# Altium integrated library Weidmueller_OMNIMATE_Signal.IntLib: 2550 symbols (part 30 of 45)
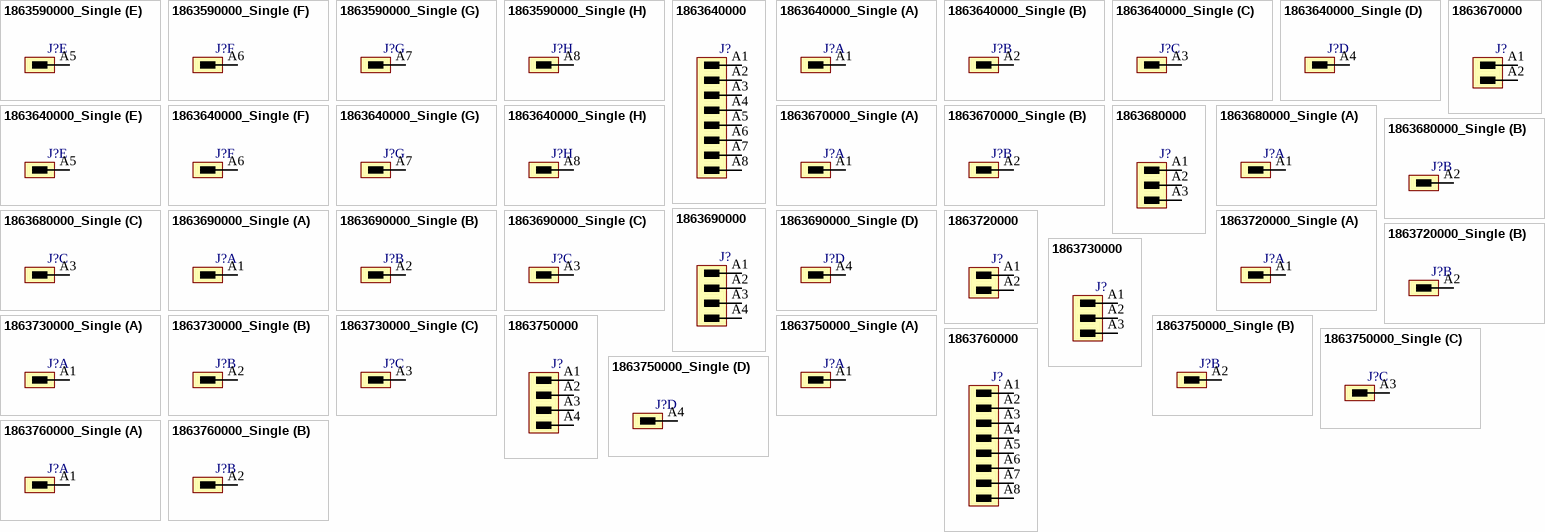
[diagram p240: symbols 1863590000_Single to 1863760000_Single]

## 1863720000
designator J?
OMNIMATE Signal - series BC/SC 3.81; PartNumber: 1863720000; Manufacturer: Weidmueller; Short_text_for_material: SC-SMT 3.81/02/180G 1.5SN BK BX; Side_termination_characteristic: closed side; Mounting_onto_the_PCB: Reflow solder connection; Pitch_mm: 3.81 mm; Pitch_inch: 0.15 inch; No_of_poles: 2; Outgoing_elbow: 180°; Solder_pin_length_mm: 1.5 mm; Contact_surface: tinned; Insulating_material: LCP GF; UL_94_flammability_rating: V-0; Rated_voltage_for_surge_voltage_class_pollution_degree_II_2: 320 V; Rated_current_min_no_of_poles_TU_20_deg_C: 17.5 A; Rated_voltage_use_group_B_UL_1059: 300 V; Rated_current_use_group_B_UL_1059: 10 A; PackageReference: SC_SMT_3_81_180G_02; Colour: Black; Packaging: Box; Qty: 50 PCS; Revision: V1; ComponentLink1Description: Manufacturer URL; ComponentLink1URL: http://www.weidmueller.com/; ComponentLink2Description: URL Link1; ComponentLink2URL: http://catalog.weidmueller.com/catalog/Start.do?localeId=en&ObjectID=1863720000
footprint SC_SMT_3_81_180G_02 (OMNIMATE Signal - Serie BC/SC 3.81  SC-SMT 3.81/02/180G 3.2)
pins: A1, A2

## 1863720000_Single
designator J?
OMNIMATE Signal - series BC/SC 3.81; PartNumber: 1863720000; Manufacturer: Weidmueller; Short_text_for_material: SC-SMT 3.81/02/180G 1.5SN BK BX; Side_termination_characteristic: closed side; Mounting_onto_the_PCB: Reflow solder connection; Pitch_mm: 3.81 mm; Pitch_inch: 0.15 inch; No_of_poles: 2; Outgoing_elbow: 180°; Solder_pin_length_mm: 1.5 mm; Contact_surface: tinned; Insulating_material: LCP GF; UL_94_flammability_rating: V-0; Rated_voltage_for_surge_voltage_class_pollution_degree_II_2: 320 V; Rated_current_min_no_of_poles_TU_20_deg_C: 17.5 A; Rated_voltage_use_group_B_UL_1059: 300 V; Rated_current_use_group_B_UL_1059: 10 A; PackageReference: SC_SMT_3_81_180G_02; Colour: Black; Packaging: Box; Qty: 50 PCS; Revision: V1; ComponentLink1Description: Manufacturer URL; ComponentLink1URL: http://www.weidmueller.com/; ComponentLink2Description: URL Link1; ComponentLink2URL: http://catalog.weidmueller.com/catalog/Start.do?localeId=en&ObjectID=1863720000
footprint SC_SMT_3_81_180G_02 (OMNIMATE Signal - Serie BC/SC 3.81  SC-SMT 3.81/02/180G 3.2)
part A pins: A1
part B pins: A2

## 1863730000
designator J?
OMNIMATE Signal - series BC/SC 3.81; PartNumber: 1863730000; Manufacturer: Weidmueller; Short_text_for_material: SC-SMT 3.81/03/180G 1.5SN BK BX; Side_termination_characteristic: closed side; Mounting_onto_the_PCB: Reflow solder connection; Pitch_mm: 3.81 mm; Pitch_inch: 0.15 inch; No_of_poles: 3; Outgoing_elbow: 180°; Solder_pin_length_mm: 1.5 mm; Contact_surface: tinned; Insulating_material: LCP GF; UL_94_flammability_rating: V-0; Rated_voltage_for_surge_voltage_class_pollution_degree_II_2: 320 V; Rated_current_min_no_of_poles_TU_20_deg_C: 17.5 A; Rated_voltage_use_group_B_UL_1059: 300 V; Rated_current_use_group_B_UL_1059: 10 A; PackageReference: SC_SMT_3_81_180G_03; Colour: Black; Packaging: Box; Qty: 50 PCS; Revision: V1; ComponentLink1Description: Manufacturer URL; ComponentLink1URL: http://www.weidmueller.com/; ComponentLink2Description: URL Link1; ComponentLink2URL: http://catalog.weidmueller.com/catalog/Start.do?localeId=en&ObjectID=1863730000
footprint SC_SMT_3_81_180G_03 (OMNIMATE Signal - Serie BC/SC 3.81  SC-SMT 3.81/03/180G 3.2)
pins: A1, A2, A3

## 1863730000_Single
designator J?
OMNIMATE Signal - series BC/SC 3.81; PartNumber: 1863730000; Manufacturer: Weidmueller; Short_text_for_material: SC-SMT 3.81/03/180G 1.5SN BK BX; Side_termination_characteristic: closed side; Mounting_onto_the_PCB: Reflow solder connection; Pitch_mm: 3.81 mm; Pitch_inch: 0.15 inch; No_of_poles: 3; Outgoing_elbow: 180°; Solder_pin_length_mm: 1.5 mm; Contact_surface: tinned; Insulating_material: LCP GF; UL_94_flammability_rating: V-0; Rated_voltage_for_surge_voltage_class_pollution_degree_II_2: 320 V; Rated_current_min_no_of_poles_TU_20_deg_C: 17.5 A; Rated_voltage_use_group_B_UL_1059: 300 V; Rated_current_use_group_B_UL_1059: 10 A; PackageReference: SC_SMT_3_81_180G_03; Colour: Black; Packaging: Box; Qty: 50 PCS; Revision: V1; ComponentLink1Description: Manufacturer URL; ComponentLink1URL: http://www.weidmueller.com/; ComponentLink2Description: URL Link1; ComponentLink2URL: http://catalog.weidmueller.com/catalog/Start.do?localeId=en&ObjectID=1863730000
footprint SC_SMT_3_81_180G_03 (OMNIMATE Signal - Serie BC/SC 3.81  SC-SMT 3.81/03/180G 3.2)
part A pins: A1
part B pins: A2
part C pins: A3

## 1863750000
designator J?
OMNIMATE Signal - series BC/SC 3.81; PartNumber: 1863750000; Manufacturer: Weidmueller; Short_text_for_material: SC-SMT 3.81/04/180G 1.5SN BK BX; Side_termination_characteristic: closed side; Mounting_onto_the_PCB: Reflow solder connection; Pitch_mm: 3.81 mm; Pitch_inch: 0.15 inch; No_of_poles: 4; Outgoing_elbow: 180°; Solder_pin_length_mm: 1.5 mm; Contact_surface: tinned; Insulating_material: LCP GF; UL_94_flammability_rating: V-0; Rated_voltage_for_surge_voltage_class_pollution_degree_II_2: 320 V; Rated_current_min_no_of_poles_TU_20_deg_C: 17.5 A; Rated_voltage_use_group_B_UL_1059: 300 V; Rated_current_use_group_B_UL_1059: 10 A; PackageReference: SC_SMT_3_81_180G_04; Colour: Black; Packaging: Box; Qty: 50 PCS; Revision: V1; ComponentLink1Description: Manufacturer URL; ComponentLink1URL: http://www.weidmueller.com/; ComponentLink2Description: URL Link1; ComponentLink2URL: http://catalog.weidmueller.com/catalog/Start.do?localeId=en&ObjectID=1863750000
footprint SC_SMT_3_81_180G_04 (OMNIMATE Signal - Serie BC/SC 3.81  SC-SMT 3.81/04/180G 3.2)
pins: A1, A2, A3, A4

## 1863750000_Single
designator J?
OMNIMATE Signal - series BC/SC 3.81; PartNumber: 1863750000; Manufacturer: Weidmueller; Short_text_for_material: SC-SMT 3.81/04/180G 1.5SN BK BX; Side_termination_characteristic: closed side; Mounting_onto_the_PCB: Reflow solder connection; Pitch_mm: 3.81 mm; Pitch_inch: 0.15 inch; No_of_poles: 4; Outgoing_elbow: 180°; Solder_pin_length_mm: 1.5 mm; Contact_surface: tinned; Insulating_material: LCP GF; UL_94_flammability_rating: V-0; Rated_voltage_for_surge_voltage_class_pollution_degree_II_2: 320 V; Rated_current_min_no_of_poles_TU_20_deg_C: 17.5 A; Rated_voltage_use_group_B_UL_1059: 300 V; Rated_current_use_group_B_UL_1059: 10 A; PackageReference: SC_SMT_3_81_180G_04; Colour: Black; Packaging: Box; Qty: 50 PCS; Revision: V1; ComponentLink1Description: Manufacturer URL; ComponentLink1URL: http://www.weidmueller.com/; ComponentLink2Description: URL Link1; ComponentLink2URL: http://catalog.weidmueller.com/catalog/Start.do?localeId=en&ObjectID=1863750000
footprint SC_SMT_3_81_180G_04 (OMNIMATE Signal - Serie BC/SC 3.81  SC-SMT 3.81/04/180G 3.2)
part A pins: A1
part B pins: A2
part C pins: A3
part D pins: A4

## 1863760000
designator J?
OMNIMATE Signal - series BC/SC 3.81; PartNumber: 1863760000; Manufacturer: Weidmueller; Short_text_for_material: SC-SMT 3.81/08/90LF 3.2SN BK BX; Side_termination_characteristic: Solder flange; Mounting_onto_the_PCB: Reflow solder connection; Pitch_mm: 3.81 mm; Pitch_inch: 0.15 inch; No_of_poles: 8; Outgoing_elbow: 90°; Solder_pin_length_mm: 3.2 mm; Contact_material: Cu-Leg; Contact_surface: tinned; Insulating_material: LCP GF; UL_94_flammability_rating: V-0; Rated_voltage_for_surge_voltage_class_pollution_degree_II_2: 320 V; Rated_current_min_no_of_poles_TU_20_deg_C: 19 A; Rated_voltage_use_group_B_UL_1059: 300 V; Rated_current_use_group_B_UL_1059: 10 A; PackageReference: SC_SMT_3_81_90LF_08; Colour: Black; Packaging: Box; Qty: 50 PCS; Revision: V1; ComponentLink1Description: Manufacturer URL; ComponentLink1URL: http://www.weidmueller.com/; ComponentLink2Description: URL Link1; ComponentLink2URL: http://catalog.weidmueller.com/catalog/Start.do?localeId=en&ObjectID=1863760000
footprint SC_SMT_3_81_90LF_08 (OMNIMATE Signal - Serie BC/SC 3.81  SC-SMT 3.81/08/90LF 3.2)
pins: A1, A2, A3, A4, A5, A6, A7, A8

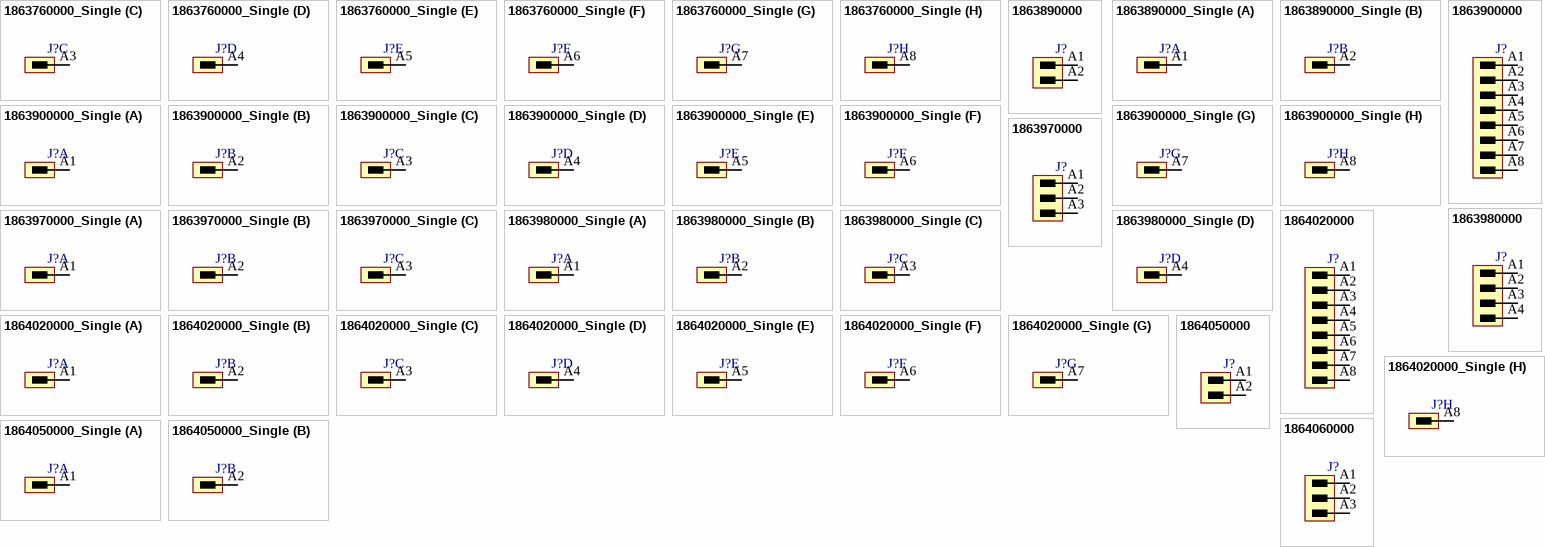
[diagram p149: symbols 1863760000_Single to 1864060000]

## 1863760000_Single
designator J?
OMNIMATE Signal - series BC/SC 3.81; PartNumber: 1863760000; Manufacturer: Weidmueller; Short_text_for_material: SC-SMT 3.81/08/90LF 3.2SN BK BX; Side_termination_characteristic: Solder flange; Mounting_onto_the_PCB: Reflow solder connection; Pitch_mm: 3.81 mm; Pitch_inch: 0.15 inch; No_of_poles: 8; Outgoing_elbow: 90°; Solder_pin_length_mm: 3.2 mm; Contact_material: Cu-Leg; Contact_surface: tinned; Insulating_material: LCP GF; UL_94_flammability_rating: V-0; Rated_voltage_for_surge_voltage_class_pollution_degree_II_2: 320 V; Rated_current_min_no_of_poles_TU_20_deg_C: 19 A; Rated_voltage_use_group_B_UL_1059: 300 V; Rated_current_use_group_B_UL_1059: 10 A; PackageReference: SC_SMT_3_81_90LF_08; Colour: Black; Packaging: Box; Qty: 50 PCS; Revision: V1; ComponentLink1Description: Manufacturer URL; ComponentLink1URL: http://www.weidmueller.com/; ComponentLink2Description: URL Link1; ComponentLink2URL: http://catalog.weidmueller.com/catalog/Start.do?localeId=en&ObjectID=1863760000
footprint SC_SMT_3_81_90LF_08 (OMNIMATE Signal - Serie BC/SC 3.81  SC-SMT 3.81/08/90LF 3.2)
part A pins: A1
part B pins: A2
part C pins: A3
part D pins: A4
part E pins: A5
part F pins: A6
part G pins: A7
part H pins: A8

## 1863890000
designator J?
OMNIMATE Signal - series BC/SC 3.81; PartNumber: 1863890000; Manufacturer: Weidmueller; Short_text_for_material: SC-SMT 3.81/02/90LF 3.2SN BK RL; Side_termination_characteristic: Solder flange; Mounting_onto_the_PCB: Reflow solder connection; Pitch_mm: 3.81 mm; Pitch_inch: 0.15 inch; No_of_poles: 2; Outgoing_elbow: 90°; Solder_pin_length_mm: 3.2 mm; Contact_surface: tinned; Insulating_material: LCP GF; UL_94_flammability_rating: V-0; Rated_voltage_for_surge_voltage_class_pollution_degree_II_2: 320 V; Rated_current_min_no_of_poles_TU_20_deg_C: 17.5 A; Rated_voltage_use_group_B_UL_1059: 300 V; Rated_current_use_group_B_UL_1059: 10 A; PackageReference: SC_SMT_3_81_90LF_02; Colour: Black; Packaging: Tape; Qty: 400 PCS; Revision: V1; ComponentLink1Description: Manufacturer URL; ComponentLink1URL: http://www.weidmueller.com/; ComponentLink2Description: URL Link1; ComponentLink2URL: http://catalog.weidmueller.com/catalog/Start.do?localeId=en&ObjectID=1863890000
footprint SC_SMT_3_81_90LF_02 (OMNIMATE Signal - Serie BC/SC 3.81  SC-SMT 3.81/02/90LF 3.2)
pins: A1, A2

## 1863890000_Single
designator J?
OMNIMATE Signal - series BC/SC 3.81; PartNumber: 1863890000; Manufacturer: Weidmueller; Short_text_for_material: SC-SMT 3.81/02/90LF 3.2SN BK RL; Side_termination_characteristic: Solder flange; Mounting_onto_the_PCB: Reflow solder connection; Pitch_mm: 3.81 mm; Pitch_inch: 0.15 inch; No_of_poles: 2; Outgoing_elbow: 90°; Solder_pin_length_mm: 3.2 mm; Contact_surface: tinned; Insulating_material: LCP GF; UL_94_flammability_rating: V-0; Rated_voltage_for_surge_voltage_class_pollution_degree_II_2: 320 V; Rated_current_min_no_of_poles_TU_20_deg_C: 17.5 A; Rated_voltage_use_group_B_UL_1059: 300 V; Rated_current_use_group_B_UL_1059: 10 A; PackageReference: SC_SMT_3_81_90LF_02; Colour: Black; Packaging: Tape; Qty: 400 PCS; Revision: V1; ComponentLink1Description: Manufacturer URL; ComponentLink1URL: http://www.weidmueller.com/; ComponentLink2Description: URL Link1; ComponentLink2URL: http://catalog.weidmueller.com/catalog/Start.do?localeId=en&ObjectID=1863890000
footprint SC_SMT_3_81_90LF_02 (OMNIMATE Signal - Serie BC/SC 3.81  SC-SMT 3.81/02/90LF 3.2)
part A pins: A1
part B pins: A2

## 1863900000
designator J?
OMNIMATE Signal - series BC/SC 3.81; PartNumber: 1863900000; Manufacturer: Weidmueller; Short_text_for_material: SC-SMT 3.81/08/180G 1.5SN BK BX; Side_termination_characteristic: closed side; Mounting_onto_the_PCB: Reflow solder connection; Pitch_mm: 3.81 mm; Pitch_inch: 0.15 inch; No_of_poles: 8; Outgoing_elbow: 180°; Solder_pin_length_mm: 1.5 mm; Contact_surface: tinned; Insulating_material: LCP GF; UL_94_flammability_rating: V-0; Rated_voltage_for_surge_voltage_class_pollution_degree_II_2: 320 V; Rated_current_min_no_of_poles_TU_20_deg_C: 17.5 A; Rated_voltage_use_group_B_UL_1059: 300 V; Rated_current_use_group_B_UL_1059: 10 A; PackageReference: SC_SMT_3_81_180G_08; Colour: Black; Packaging: Box; Qty: 50 PCS; Revision: V1; ComponentLink1Description: Manufacturer URL; ComponentLink1URL: http://www.weidmueller.com/; ComponentLink2Description: URL Link1; ComponentLink2URL: http://catalog.weidmueller.com/catalog/Start.do?localeId=en&ObjectID=1863900000
footprint SC_SMT_3_81_180G_08 (OMNIMATE Signal - Serie BC/SC 3.81  SC-SMT 3.81/08/180G 3.2)
pins: A1, A2, A3, A4, A5, A6, A7, A8

## 1863900000_Single
designator J?
OMNIMATE Signal - series BC/SC 3.81; PartNumber: 1863900000; Manufacturer: Weidmueller; Short_text_for_material: SC-SMT 3.81/08/180G 1.5SN BK BX; Side_termination_characteristic: closed side; Mounting_onto_the_PCB: Reflow solder connection; Pitch_mm: 3.81 mm; Pitch_inch: 0.15 inch; No_of_poles: 8; Outgoing_elbow: 180°; Solder_pin_length_mm: 1.5 mm; Contact_surface: tinned; Insulating_material: LCP GF; UL_94_flammability_rating: V-0; Rated_voltage_for_surge_voltage_class_pollution_degree_II_2: 320 V; Rated_current_min_no_of_poles_TU_20_deg_C: 17.5 A; Rated_voltage_use_group_B_UL_1059: 300 V; Rated_current_use_group_B_UL_1059: 10 A; PackageReference: SC_SMT_3_81_180G_08; Colour: Black; Packaging: Box; Qty: 50 PCS; Revision: V1; ComponentLink1Description: Manufacturer URL; ComponentLink1URL: http://www.weidmueller.com/; ComponentLink2Description: URL Link1; ComponentLink2URL: http://catalog.weidmueller.com/catalog/Start.do?localeId=en&ObjectID=1863900000
footprint SC_SMT_3_81_180G_08 (OMNIMATE Signal - Serie BC/SC 3.81  SC-SMT 3.81/08/180G 3.2)
part A pins: A1
part B pins: A2
part C pins: A3
part D pins: A4
part E pins: A5
part F pins: A6
part G pins: A7
part H pins: A8

## 1863970000
designator J?
OMNIMATE Signal - series BC/SC 3.81; PartNumber: 1863970000; Manufacturer: Weidmueller; Short_text_for_material: SC-SMT 3.81/03/90LF 3.2SN BK RL; Side_termination_characteristic: Solder flange; Mounting_onto_the_PCB: Reflow solder connection; Pitch_mm: 3.81 mm; Pitch_inch: 0.15 inch; No_of_poles: 3; Outgoing_elbow: 90°; Solder_pin_length_mm: 3.2 mm; Contact_surface: tinned; Insulating_material: LCP GF; UL_94_flammability_rating: V-0; Rated_voltage_for_surge_voltage_class_pollution_degree_II_2: 320 V; Rated_current_min_no_of_poles_TU_20_deg_C: 17.5 A; Rated_voltage_use_group_B_UL_1059: 300 V; Rated_current_use_group_B_UL_1059: 10 A; PackageReference: SC_SMT_3_81_90LF_03; Colour: Black; Packaging: Tape; Qty: 400 PCS; Revision: V1; ComponentLink1Description: Manufacturer URL; ComponentLink1URL: http://www.weidmueller.com/; ComponentLink2Description: URL Link1; ComponentLink2URL: http://catalog.weidmueller.com/catalog/Start.do?localeId=en&ObjectID=1863970000
footprint SC_SMT_3_81_90LF_03 (OMNIMATE Signal - Serie BC/SC 3.81  SC-SMT 3.81/03/90LF 3.2)
pins: A1, A2, A3

## 1863970000_Single
designator J?
OMNIMATE Signal - series BC/SC 3.81; PartNumber: 1863970000; Manufacturer: Weidmueller; Short_text_for_material: SC-SMT 3.81/03/90LF 3.2SN BK RL; Side_termination_characteristic: Solder flange; Mounting_onto_the_PCB: Reflow solder connection; Pitch_mm: 3.81 mm; Pitch_inch: 0.15 inch; No_of_poles: 3; Outgoing_elbow: 90°; Solder_pin_length_mm: 3.2 mm; Contact_surface: tinned; Insulating_material: LCP GF; UL_94_flammability_rating: V-0; Rated_voltage_for_surge_voltage_class_pollution_degree_II_2: 320 V; Rated_current_min_no_of_poles_TU_20_deg_C: 17.5 A; Rated_voltage_use_group_B_UL_1059: 300 V; Rated_current_use_group_B_UL_1059: 10 A; PackageReference: SC_SMT_3_81_90LF_03; Colour: Black; Packaging: Tape; Qty: 400 PCS; Revision: V1; ComponentLink1Description: Manufacturer URL; ComponentLink1URL: http://www.weidmueller.com/; ComponentLink2Description: URL Link1; ComponentLink2URL: http://catalog.weidmueller.com/catalog/Start.do?localeId=en&ObjectID=1863970000
footprint SC_SMT_3_81_90LF_03 (OMNIMATE Signal - Serie BC/SC 3.81  SC-SMT 3.81/03/90LF 3.2)
part A pins: A1
part B pins: A2
part C pins: A3

## 1863980000
designator J?
OMNIMATE Signal - series BC/SC 3.81; PartNumber: 1863980000; Manufacturer: Weidmueller; Short_text_for_material: SC-SMT 3.81/04/90LF 3.2SN BK RL; Side_termination_characteristic: Solder flange; Mounting_onto_the_PCB: Reflow solder connection; Pitch_mm: 3.81 mm; Pitch_inch: 0.15 inch; No_of_poles: 4; Outgoing_elbow: 90°; Solder_pin_length_mm: 3.2 mm; Contact_surface: tinned; Insulating_material: LCP GF; UL_94_flammability_rating: V-0; Rated_voltage_for_surge_voltage_class_pollution_degree_II_2: 320 V; Rated_current_min_no_of_poles_TU_20_deg_C: 17.5 A; Rated_voltage_use_group_B_UL_1059: 300 V; Rated_current_use_group_B_UL_1059: 10 A; PackageReference: SC_SMT_3_81_90LF_04; Colour: Black; Packaging: Tape; Qty: 400 PCS; Revision: V1; ComponentLink1Description: Manufacturer URL; ComponentLink1URL: http://www.weidmueller.com/; ComponentLink2Description: URL Link1; ComponentLink2URL: http://catalog.weidmueller.com/catalog/Start.do?localeId=en&ObjectID=1863980000
footprint SC_SMT_3_81_90LF_04 (OMNIMATE Signal - Serie BC/SC 3.81  SC-SMT 3.81/04/90LF 3.2)
pins: A1, A2, A3, A4

## 1863980000_Single
designator J?
OMNIMATE Signal - series BC/SC 3.81; PartNumber: 1863980000; Manufacturer: Weidmueller; Short_text_for_material: SC-SMT 3.81/04/90LF 3.2SN BK RL; Side_termination_characteristic: Solder flange; Mounting_onto_the_PCB: Reflow solder connection; Pitch_mm: 3.81 mm; Pitch_inch: 0.15 inch; No_of_poles: 4; Outgoing_elbow: 90°; Solder_pin_length_mm: 3.2 mm; Contact_surface: tinned; Insulating_material: LCP GF; UL_94_flammability_rating: V-0; Rated_voltage_for_surge_voltage_class_pollution_degree_II_2: 320 V; Rated_current_min_no_of_poles_TU_20_deg_C: 17.5 A; Rated_voltage_use_group_B_UL_1059: 300 V; Rated_current_use_group_B_UL_1059: 10 A; PackageReference: SC_SMT_3_81_90LF_04; Colour: Black; Packaging: Tape; Qty: 400 PCS; Revision: V1; ComponentLink1Description: Manufacturer URL; ComponentLink1URL: http://www.weidmueller.com/; ComponentLink2Description: URL Link1; ComponentLink2URL: http://catalog.weidmueller.com/catalog/Start.do?localeId=en&ObjectID=1863980000
footprint SC_SMT_3_81_90LF_04 (OMNIMATE Signal - Serie BC/SC 3.81  SC-SMT 3.81/04/90LF 3.2)
part A pins: A1
part B pins: A2
part C pins: A3
part D pins: A4

## 1864020000
designator J?
OMNIMATE Signal - series BC/SC 3.81; PartNumber: 1864020000; Manufacturer: Weidmueller; Short_text_for_material: SC-SMT 3.81/08/90LF 3.2SN BK RL; Side_termination_characteristic: Solder flange; Mounting_onto_the_PCB: Reflow solder connection; Pitch_mm: 3.81 mm; Pitch_inch: 0.15 inch; No_of_poles: 8; Outgoing_elbow: 90°; Solder_pin_length_mm: 3.2 mm; Contact_surface: tinned; Insulating_material: LCP GF; UL_94_flammability_rating: V-0; Rated_voltage_for_surge_voltage_class_pollution_degree_II_2: 320 V; Rated_current_min_no_of_poles_TU_20_deg_C: 17.5 A; Rated_voltage_use_group_B_UL_1059: 300 V; Rated_current_use_group_B_UL_1059: 10 A; PackageReference: SC_SMT_3_81_90LF_08; Colour: Black; Packaging: Tape; Qty: 400 PCS; Revision: V1; ComponentLink1Description: Manufacturer URL; ComponentLink1URL: http://www.weidmueller.com/; ComponentLink2Description: URL Link1; ComponentLink2URL: http://catalog.weidmueller.com/catalog/Start.do?localeId=en&ObjectID=1864020000
footprint SC_SMT_3_81_90LF_08 (OMNIMATE Signal - Serie BC/SC 3.81  SC-SMT 3.81/08/90LF 3.2)
pins: A1, A2, A3, A4, A5, A6, A7, A8

## 1864020000_Single
designator J?
OMNIMATE Signal - series BC/SC 3.81; PartNumber: 1864020000; Manufacturer: Weidmueller; Short_text_for_material: SC-SMT 3.81/08/90LF 3.2SN BK RL; Side_termination_characteristic: Solder flange; Mounting_onto_the_PCB: Reflow solder connection; Pitch_mm: 3.81 mm; Pitch_inch: 0.15 inch; No_of_poles: 8; Outgoing_elbow: 90°; Solder_pin_length_mm: 3.2 mm; Contact_surface: tinned; Insulating_material: LCP GF; UL_94_flammability_rating: V-0; Rated_voltage_for_surge_voltage_class_pollution_degree_II_2: 320 V; Rated_current_min_no_of_poles_TU_20_deg_C: 17.5 A; Rated_voltage_use_group_B_UL_1059: 300 V; Rated_current_use_group_B_UL_1059: 10 A; PackageReference: SC_SMT_3_81_90LF_08; Colour: Black; Packaging: Tape; Qty: 400 PCS; Revision: V1; ComponentLink1Description: Manufacturer URL; ComponentLink1URL: http://www.weidmueller.com/; ComponentLink2Description: URL Link1; ComponentLink2URL: http://catalog.weidmueller.com/catalog/Start.do?localeId=en&ObjectID=1864020000
footprint SC_SMT_3_81_90LF_08 (OMNIMATE Signal - Serie BC/SC 3.81  SC-SMT 3.81/08/90LF 3.2)
part A pins: A1
part B pins: A2
part C pins: A3
part D pins: A4
part E pins: A5
part F pins: A6
part G pins: A7
part H pins: A8

## 1864050000
designator J?
OMNIMATE Signal - series BC/SC 3.81; PartNumber: 1864050000; Manufacturer: Weidmueller; Short_text_for_material: SC-SMT 3.81/02/180G 1.5SN BK RL; Side_termination_characteristic: closed side; Mounting_onto_the_PCB: Reflow solder connection; Pitch_mm: 3.81 mm; Pitch_inch: 0.15 inch; No_of_poles: 2; Outgoing_elbow: 180°; Solder_pin_length_mm: 1.5 mm; Contact_surface: tinned; Insulating_material: LCP GF; UL_94_flammability_rating: V-0; Rated_voltage_for_surge_voltage_class_pollution_degree_II_2: 320 V; Rated_current_min_no_of_poles_TU_20_deg_C: 17.5 A; Rated_voltage_use_group_B_UL_1059: 300 V; Rated_current_use_group_B_UL_1059: 10 A; PackageReference: SC_SMT_3_81_180G_02; Colour: Black; Packaging: Tape; Qty: 300 PCS; Revision: V1; ComponentLink1Description: Manufacturer URL; ComponentLink1URL: http://www.weidmueller.com/; ComponentLink2Description: URL Link1; ComponentLink2URL: http://catalog.weidmueller.com/catalog/Start.do?localeId=en&ObjectID=1864050000
footprint SC_SMT_3_81_180G_02 (OMNIMATE Signal - Serie BC/SC 3.81  SC-SMT 3.81/02/180G 3.2)
pins: A1, A2

## 1864050000_Single
designator J?
OMNIMATE Signal - series BC/SC 3.81; PartNumber: 1864050000; Manufacturer: Weidmueller; Short_text_for_material: SC-SMT 3.81/02/180G 1.5SN BK RL; Side_termination_characteristic: closed side; Mounting_onto_the_PCB: Reflow solder connection; Pitch_mm: 3.81 mm; Pitch_inch: 0.15 inch; No_of_poles: 2; Outgoing_elbow: 180°; Solder_pin_length_mm: 1.5 mm; Contact_surface: tinned; Insulating_material: LCP GF; UL_94_flammability_rating: V-0; Rated_voltage_for_surge_voltage_class_pollution_degree_II_2: 320 V; Rated_current_min_no_of_poles_TU_20_deg_C: 17.5 A; Rated_voltage_use_group_B_UL_1059: 300 V; Rated_current_use_group_B_UL_1059: 10 A; PackageReference: SC_SMT_3_81_180G_02; Colour: Black; Packaging: Tape; Qty: 300 PCS; Revision: V1; ComponentLink1Description: Manufacturer URL; ComponentLink1URL: http://www.weidmueller.com/; ComponentLink2Description: URL Link1; ComponentLink2URL: http://catalog.weidmueller.com/catalog/Start.do?localeId=en&ObjectID=1864050000
footprint SC_SMT_3_81_180G_02 (OMNIMATE Signal - Serie BC/SC 3.81  SC-SMT 3.81/02/180G 3.2)
part A pins: A1
part B pins: A2

## 1864060000
designator J?
OMNIMATE Signal - series BC/SC 3.81; PartNumber: 1864060000; Manufacturer: Weidmueller; Short_text_for_material: SC-SMT 3.81/03/180G 1.5SN BK RL; Side_termination_characteristic: closed side; Mounting_onto_the_PCB: Reflow solder connection; Pitch_mm: 3.81 mm; Pitch_inch: 0.15 inch; No_of_poles: 3; Outgoing_elbow: 180°; Solder_pin_length_mm: 1.5 mm; Contact_surface: tinned; Insulating_material: LCP GF; UL_94_flammability_rating: V-0; Rated_voltage_for_surge_voltage_class_pollution_degree_II_2: 320 V; Rated_current_min_no_of_poles_TU_20_deg_C: 17.5 A; Rated_voltage_use_group_B_UL_1059: 300 V; Rated_current_use_group_B_UL_1059: 10 A; PackageReference: SC_SMT_3_81_180G_03; Colour: Black; Packaging: Tape; Qty: 300 PCS; Revision: V1; ComponentLink1Description: Manufacturer URL; ComponentLink1URL: http://www.weidmueller.com/; ComponentLink2Description: URL Link1; ComponentLink2URL: http://catalog.weidmueller.com/catalog/Start.do?localeId=en&ObjectID=1864060000
footprint SC_SMT_3_81_180G_03 (OMNIMATE Signal - Serie BC/SC 3.81  SC-SMT 3.81/03/180G 3.2)
pins: A1, A2, A3

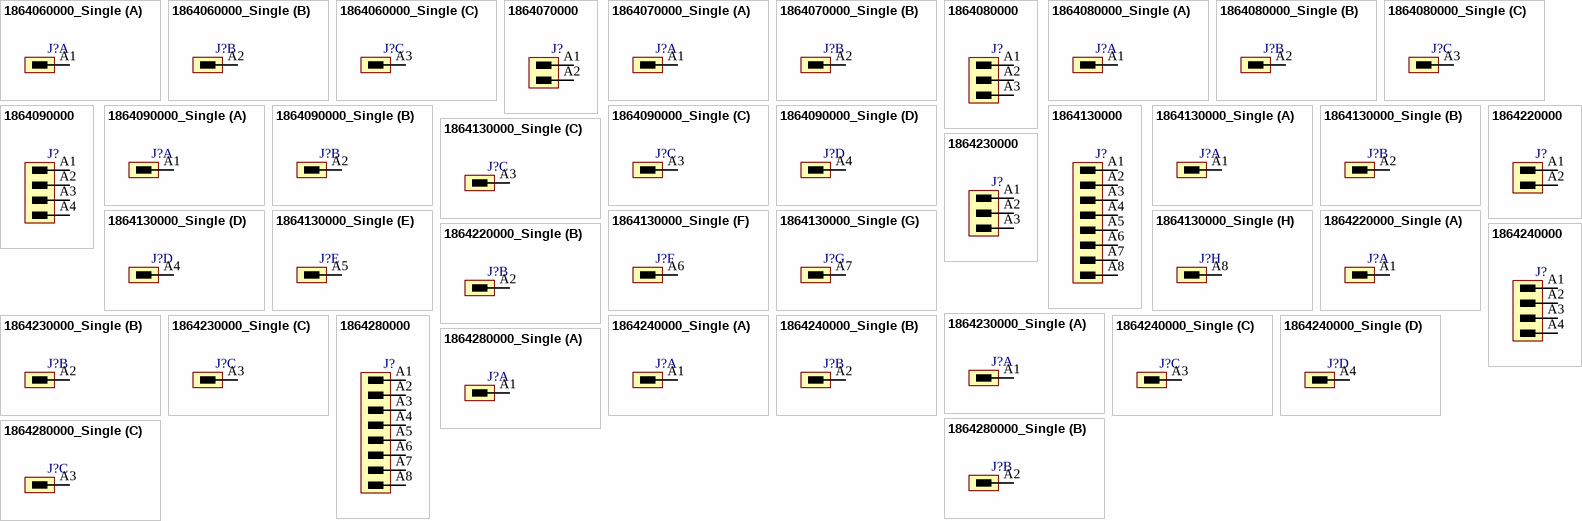
[diagram p150: symbols 1864060000_Single to 1864280000_Single]

## 1864060000_Single
designator J?
OMNIMATE Signal - series BC/SC 3.81; PartNumber: 1864060000; Manufacturer: Weidmueller; Short_text_for_material: SC-SMT 3.81/03/180G 1.5SN BK RL; Side_termination_characteristic: closed side; Mounting_onto_the_PCB: Reflow solder connection; Pitch_mm: 3.81 mm; Pitch_inch: 0.15 inch; No_of_poles: 3; Outgoing_elbow: 180°; Solder_pin_length_mm: 1.5 mm; Contact_surface: tinned; Insulating_material: LCP GF; UL_94_flammability_rating: V-0; Rated_voltage_for_surge_voltage_class_pollution_degree_II_2: 320 V; Rated_current_min_no_of_poles_TU_20_deg_C: 17.5 A; Rated_voltage_use_group_B_UL_1059: 300 V; Rated_current_use_group_B_UL_1059: 10 A; PackageReference: SC_SMT_3_81_180G_03; Colour: Black; Packaging: Tape; Qty: 300 PCS; Revision: V1; ComponentLink1Description: Manufacturer URL; ComponentLink1URL: http://www.weidmueller.com/; ComponentLink2Description: URL Link1; ComponentLink2URL: http://catalog.weidmueller.com/catalog/Start.do?localeId=en&ObjectID=1864060000
footprint SC_SMT_3_81_180G_03 (OMNIMATE Signal - Serie BC/SC 3.81  SC-SMT 3.81/03/180G 3.2)
part A pins: A1
part B pins: A2
part C pins: A3

## 1864070000
designator J?
OMNIMATE Signal - series BC/SC 3.81; PartNumber: 1864070000; Manufacturer: Weidmueller; Short_text_for_material: SC-SMT 3.81/02/180LF 1.5SN BK BX; Side_termination_characteristic: Solder flange; Mounting_onto_the_PCB: Reflow solder connection; Pitch_mm: 3.81 mm; Pitch_inch: 0.15 inch; No_of_poles: 2; Outgoing_elbow: 180°; Solder_pin_length_mm: 1.5 mm; Contact_surface: tinned; Insulating_material: LCP GF; UL_94_flammability_rating: V-0; Rated_voltage_for_surge_voltage_class_pollution_degree_II_2: 320 V; Rated_current_min_no_of_poles_TU_20_deg_C: 17.5 A; Rated_voltage_use_group_B_UL_1059: 300 V; Rated_current_use_group_B_UL_1059: 10 A; PackageReference: SC_SMT_3_81_180LF_02; Colour: Black; Packaging: Box; Qty: 50 PCS; Revision: V1; ComponentLink1Description: Manufacturer URL; ComponentLink1URL: http://www.weidmueller.com/; ComponentLink2Description: URL Link1; ComponentLink2URL: http://catalog.weidmueller.com/catalog/Start.do?localeId=en&ObjectID=1864070000
footprint SC_SMT_3_81_180LF_02 (OMNIMATE Signal - Serie BC/SC 3.81  SC-SMT 3.81/02/180LF 3.2)
pins: A1, A2

## 1864070000_Single
designator J?
OMNIMATE Signal - series BC/SC 3.81; PartNumber: 1864070000; Manufacturer: Weidmueller; Short_text_for_material: SC-SMT 3.81/02/180LF 1.5SN BK BX; Side_termination_characteristic: Solder flange; Mounting_onto_the_PCB: Reflow solder connection; Pitch_mm: 3.81 mm; Pitch_inch: 0.15 inch; No_of_poles: 2; Outgoing_elbow: 180°; Solder_pin_length_mm: 1.5 mm; Contact_surface: tinned; Insulating_material: LCP GF; UL_94_flammability_rating: V-0; Rated_voltage_for_surge_voltage_class_pollution_degree_II_2: 320 V; Rated_current_min_no_of_poles_TU_20_deg_C: 17.5 A; Rated_voltage_use_group_B_UL_1059: 300 V; Rated_current_use_group_B_UL_1059: 10 A; PackageReference: SC_SMT_3_81_180LF_02; Colour: Black; Packaging: Box; Qty: 50 PCS; Revision: V1; ComponentLink1Description: Manufacturer URL; ComponentLink1URL: http://www.weidmueller.com/; ComponentLink2Description: URL Link1; ComponentLink2URL: http://catalog.weidmueller.com/catalog/Start.do?localeId=en&ObjectID=1864070000
footprint SC_SMT_3_81_180LF_02 (OMNIMATE Signal - Serie BC/SC 3.81  SC-SMT 3.81/02/180LF 3.2)
part A pins: A1
part B pins: A2

## 1864080000
designator J?
OMNIMATE Signal - series BC/SC 3.81; PartNumber: 1864080000; Manufacturer: Weidmueller; Short_text_for_material: SC-SMT 3.81/03/180LF 1.5SN BK BX; Side_termination_characteristic: Solder flange; Mounting_onto_the_PCB: Reflow solder connection; Pitch_mm: 3.81 mm; Pitch_inch: 0.15 inch; No_of_poles: 3; Outgoing_elbow: 180°; Solder_pin_length_mm: 1.5 mm; Contact_surface: tinned; Insulating_material: LCP GF; UL_94_flammability_rating: V-0; Rated_voltage_for_surge_voltage_class_pollution_degree_II_2: 320 V; Rated_current_min_no_of_poles_TU_20_deg_C: 17.5 A; Rated_voltage_use_group_B_UL_1059: 300 V; Rated_current_use_group_B_UL_1059: 10 A; PackageReference: SC_SMT_3_81_180LF_03; Colour: Black; Packaging: Box; Qty: 50 PCS; Revision: V1; ComponentLink1Description: Manufacturer URL; ComponentLink1URL: http://www.weidmueller.com/; ComponentLink2Description: URL Link1; ComponentLink2URL: http://catalog.weidmueller.com/catalog/Start.do?localeId=en&ObjectID=1864080000
footprint SC_SMT_3_81_180LF_03 (OMNIMATE Signal - Serie BC/SC 3.81  SC-SMT 3.81/03/180LF 3.2)
pins: A1, A2, A3

## 1864080000_Single
designator J?
OMNIMATE Signal - series BC/SC 3.81; PartNumber: 1864080000; Manufacturer: Weidmueller; Short_text_for_material: SC-SMT 3.81/03/180LF 1.5SN BK BX; Side_termination_characteristic: Solder flange; Mounting_onto_the_PCB: Reflow solder connection; Pitch_mm: 3.81 mm; Pitch_inch: 0.15 inch; No_of_poles: 3; Outgoing_elbow: 180°; Solder_pin_length_mm: 1.5 mm; Contact_surface: tinned; Insulating_material: LCP GF; UL_94_flammability_rating: V-0; Rated_voltage_for_surge_voltage_class_pollution_degree_II_2: 320 V; Rated_current_min_no_of_poles_TU_20_deg_C: 17.5 A; Rated_voltage_use_group_B_UL_1059: 300 V; Rated_current_use_group_B_UL_1059: 10 A; PackageReference: SC_SMT_3_81_180LF_03; Colour: Black; Packaging: Box; Qty: 50 PCS; Revision: V1; ComponentLink1Description: Manufacturer URL; ComponentLink1URL: http://www.weidmueller.com/; ComponentLink2Description: URL Link1; ComponentLink2URL: http://catalog.weidmueller.com/catalog/Start.do?localeId=en&ObjectID=1864080000
footprint SC_SMT_3_81_180LF_03 (OMNIMATE Signal - Serie BC/SC 3.81  SC-SMT 3.81/03/180LF 3.2)
part A pins: A1
part B pins: A2
part C pins: A3

## 1864090000
designator J?
OMNIMATE Signal - series BC/SC 3.81; PartNumber: 1864090000; Manufacturer: Weidmueller; Short_text_for_material: SC-SMT 3.81/04/180LF 1.5SN BK BX; Side_termination_characteristic: Solder flange; Mounting_onto_the_PCB: Reflow solder connection; Pitch_mm: 3.81 mm; Pitch_inch: 0.15 inch; No_of_poles: 4; Outgoing_elbow: 180°; Solder_pin_length_mm: 1.5 mm; Contact_surface: tinned; Insulating_material: LCP GF; UL_94_flammability_rating: V-0; Rated_voltage_for_surge_voltage_class_pollution_degree_II_2: 320 V; Rated_current_min_no_of_poles_TU_20_deg_C: 17.5 A; Rated_voltage_use_group_B_UL_1059: 300 V; Rated_current_use_group_B_UL_1059: 10 A; PackageReference: SC_SMT_3_81_180LF_04; Colour: Black; Packaging: Box; Qty: 50 PCS; Revision: V1; ComponentLink1Description: Manufacturer URL; ComponentLink1URL: http://www.weidmueller.com/; ComponentLink2Description: URL Link1; ComponentLink2URL: http://catalog.weidmueller.com/catalog/Start.do?localeId=en&ObjectID=1864090000
footprint SC_SMT_3_81_180LF_04 (OMNIMATE Signal - Serie BC/SC 3.81  SC-SMT 3.81/04/180LF 3.2)
pins: A1, A2, A3, A4

## 1864090000_Single
designator J?
OMNIMATE Signal - series BC/SC 3.81; PartNumber: 1864090000; Manufacturer: Weidmueller; Short_text_for_material: SC-SMT 3.81/04/180LF 1.5SN BK BX; Side_termination_characteristic: Solder flange; Mounting_onto_the_PCB: Reflow solder connection; Pitch_mm: 3.81 mm; Pitch_inch: 0.15 inch; No_of_poles: 4; Outgoing_elbow: 180°; Solder_pin_length_mm: 1.5 mm; Contact_surface: tinned; Insulating_material: LCP GF; UL_94_flammability_rating: V-0; Rated_voltage_for_surge_voltage_class_pollution_degree_II_2: 320 V; Rated_current_min_no_of_poles_TU_20_deg_C: 17.5 A; Rated_voltage_use_group_B_UL_1059: 300 V; Rated_current_use_group_B_UL_1059: 10 A; PackageReference: SC_SMT_3_81_180LF_04; Colour: Black; Packaging: Box; Qty: 50 PCS; Revision: V1; ComponentLink1Description: Manufacturer URL; ComponentLink1URL: http://www.weidmueller.com/; ComponentLink2Description: URL Link1; ComponentLink2URL: http://catalog.weidmueller.com/catalog/Start.do?localeId=en&ObjectID=1864090000
footprint SC_SMT_3_81_180LF_04 (OMNIMATE Signal - Serie BC/SC 3.81  SC-SMT 3.81/04/180LF 3.2)
part A pins: A1
part B pins: A2
part C pins: A3
part D pins: A4

## 1864130000
designator J?